# Altium footprint library MEBot.PcbLib: 161 footprints (part 10 of 11)
Each footprint in its own frame and in the unit in brackets; x right, y up, seen from the top. Pads: shape width x height; smd on the part's side, far side on the other; paste and mask are expansions set on the pad; w line width, h text height; cw(c..) or ccw(c..) is an arc to the next point about the centre after c.
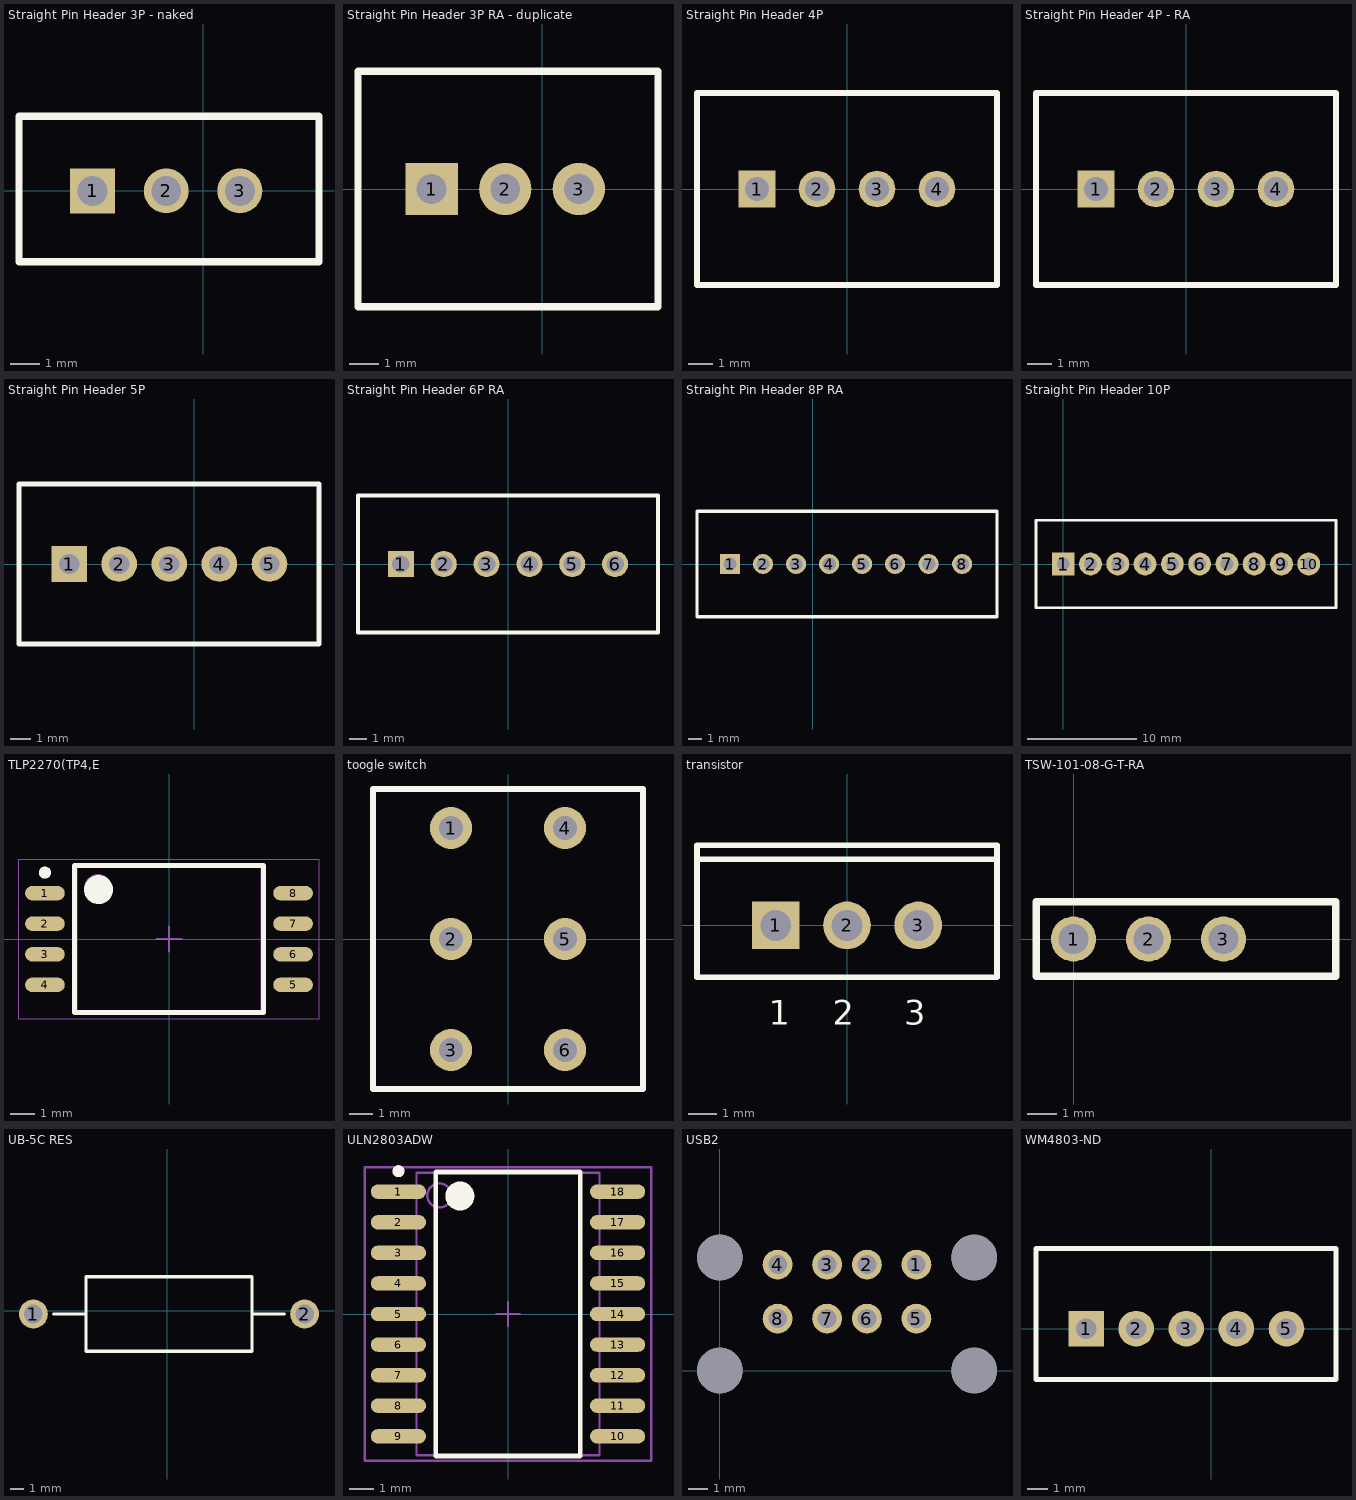
[diagram p9: the footprints below, top view; thin cyan lines are the x and y axes]

## Straight Pin Header 3P - naked [mil] "2.5mm pitch header for full lock & discrete wire connection"
height 433.07
pads (3):
  rect 60x60 hole 40: 1(-147.64,0)
  round 60 hole 40: 2(-49.21,0) 3(49.21,0)
Top Overlay:
  lines w10: -246.06,-95 155,-95 155,100 -246.06,100 -246.06,-95

## Straight Pin Header 3P RA - duplicate [mil] "2.5mm pitch header for full lock & discrete wire connection"
height 433.07
pads (3):
  rect 70x70 hole 40: 1(-147.64,0)
  round 70 hole 40: 2(-49.21,0) 3(49.21,0)
Top Overlay:
  lines w10: -246.06,-157.48 155,-157.48 155,157.48 -246.06,157.48 -246.06,-157.48
3D body "DF1E-3P-2.5DS.stp": height 75.2, standoff -373.62, extent -246,-425.74 147.71,117.57

## Straight Pin Header 4P [mil] "2.5mm pitch header for full lock & discrete wire connection"
height 433.07
pads (4):
  rect 60x60 hole 40: 1(-147.64,0)
  round 60 hole 40: 2(-49.21,0) 3(49.21,0) 4(147.64,0)
Top Overlay:
  lines w10: -246.06,-157.48 246.06,-157.48 246.06,157.48 -246.06,157.48 -246.06,-157.48
3D body "hirose_conn_header4p.stp": height 445.2, standoff -121.73, extent -251.06,-162.48 241.06,172.17

## Straight Pin Header 4P - RA [mil] "2.5mm pitch header for full lock & discrete wire connection"
height 433.07
pads (4):
  rect 60x60 hole 40: 1(-147.64,0)
  round 60 hole 40: 2(-49.21,0) 3(49.21,0) 4(147.64,0)
Top Overlay:
  lines w10: -246.06,-157.48 246.06,-157.48 246.06,157.48 -246.06,157.48 -246.06,-157.48
3D body "DF1E-4P-2.5DS.STEP": height 353.62, standoff -95.2, extent -245,-421.65 247.13,121.65

## Straight Pin Header 5P [mil] "2.5mm pitch header for full lock & discrete wire connection"
height 433.07
pads (5):
  rect 70x70 hole 40: 1(-246.06,0)
  round 70 hole 40: 2(-147.64,0) 3(-49.21,0) 4(49.21,0) 5(147.64,0)
Top Overlay:
  lines w10: -344.49,-157.48 245,-157.48 245,157.48 -344.49,157.48 -344.49,-157.48
3D body "straight 5P header.stp": height 475.2, standoff -91.73, extent -345,-145 245.55,189.65

## Straight Pin Header 6P RA [mil] "2.5mm pitch header for full lock & discrete wire connection"
height 433.07
pads (6):
  rect 60x60 hole 40: 1(-246.06,0)
  round 60 hole 40: 2(-147.64,0) 3(-49.21,0) 4(49.21,0) 5(147.64,0) 6(246.06,0)
Top Overlay:
  lines w10: -344.49,-157.48 -344.49,157.48 344.49,157.48 344.49,-157.48 -344.49,-157.48
3D body "DF1E-6P-2.5DS.stp": height 343.62, standoff -105.2, extent -347.67,-425.19 341.31,118.12

## Straight Pin Header 8P RA [mil] "2.5mm pitch header for full lock & discrete wire connection"
height 433.07
pads (8):
  rect 60x60 hole 40: 1(-246.06,0)
  round 60 hole 40: 2(-147.64,0) 3(-49.21,0) 4(49.21,0) 5(147.64,0) 6(246.06,0) 7(346.06,0) 8(446.06,0)
Top Overlay:
  lines w10: -344.49,-157.48 550,-157.48 550,157.48 -344.49,157.48 -344.49,-157.48
3D body "DF1E-8P-2.5DS.stp": height 343.62, standoff -105.2, extent -342.91,-430 542.91,113.31

## Straight Pin Header 10P [mm] "2.5mm pitch header for full lock & discrete wire connection"
height 11
pads (10):
  rect 2.1x2.1 hole 1.18: 1(0,0)
  round 2.1 hole 1.18: 2(2.5,0) 3(5,0) 4(7.5,0) 5(10,0) 6(12.5,0) 7(15,0) 8(17.5,0) 9(20,0) 10(22.5,0)
Top Overlay:
  lines w0.254: -2.5,-4 -2.5,4 25,4 25,-4 -2.5,-4
3D body: height 10.69, standoff 0, extent -2.627,-4.127 25.127,4.127
3D body: height 3.61, standoff 0, extent 21.893,-0.61 23.092,0.592
3D body: height 3.61, standoff 0, extent 19.403,-0.61 20.603,0.592
3D body: height 3.61, standoff 0, extent 16.914,-0.61 18.113,0.592
3D body: height 3.61, standoff 0, extent 14.4,-0.584 15.599,0.617
3D body: height 3.61, standoff 0, extent 11.92,-0.617 13.12,0.584
3D body: height 3.61, standoff 0, extent 9.396,-0.601 10.595,0.601
3D body: height 3.61, standoff 0, extent 6.907,-0.575 8.106,0.626
3D body: height 3.61, standoff 0, extent 4.392,-0.617 5.591,0.584
3D body: height 3.61, standoff 0, extent 1.928,-0.626 3.127,0.575
3D body: height 3.61, standoff 0, extent -0.612,-0.601 0.587,0.601

## TLP2270(TP4,E [mm] "PHOTOCOUPLER HI-SPEED LOW INPUT"
height 2.1
pads (8):
  oval 1.65x0.6 smd: 1(-5.15,1.905) 2(-5.15,0.635) 3(-5.15,-0.635) 4(-5.15,-1.905) 5(5.15,-1.905) 6(5.15,-0.635) 7(5.15,0.635) 8(5.15,1.905)
Top Overlay:
  circle w0.25: c-5.15,2.755 r0.125
  circle w0.6: c-2.925,2.05 r0.3
  lines w0.2: -3.925,-3.05 -3.925,3.05 3.925,3.05 3.925,-3.05 -3.925,-3.05
Mechanical 13:
  circle w0.1: c-2.95,2.15 r0.5
  lines w0.1: -3.85,-3.05 -3.85,3.05 3.85,3.05 3.85,-3.05 -3.85,-3.05
Mechanical 15:
  lines w0.05: -6.225,-3.3 -6.225,3.3 6.225,3.3 6.225,-3.3 -6.225,-3.3
  lines w0.1: -0.5,0 0.5,0 ; 0,-0.5 0,0.5
3D body: height 2.1, standoff 0.1, extent -3.85,-3.05 3.85,3.05

## toogle switch [mil]
pads (6):
  round 70 hole 40: 1(-95,185) 2(-95,0) 3(-95,-185) 4(95,185) 5(95,0) 6(95,-185)
Top Overlay:
  lines w10: -225,-250 225,-250 225,250 -225,250 -225,-250
3D body "toggle_switch.STEP": height 774.33, standoff -137.09, extent -223.82,-250 225,250

## transistor [mm] "TO, Thru-Hole, Vertical, Heatsink Mounted; 3 In-Line Leads; Pitch 2.54 mm"
height 22.9
pads (3):
  rect 1.7x1.7 hole 1.1: 1(-2.54,0)
  round 1.7 hole 1.1: 2(0,0) 3(2.54,0)
Top Overlay:
  lines w0.2: -5.35,2.35 5.35,2.35 ; -5.35,-1.85 -5.35,2.85 5.35,2.85 5.35,-1.85 -5.35,-1.85
  text "3" at 2.04,-3.825 h1.5
  text "2" at -0.5,-3.825 h1.5
  text "1" at -2.79,-3.825 h1.5
3D body "TO-220.STEP": height 21.71, standoff -7.36, extent -5.18,-1.495 4.98,2.7

## TSW-101-08-G-T-RA [mil] "CONN HEADER R/A 3POS"
pads (3):
  round 60 hole 40: 1(0,0) 2(100,0) 3(200,0)
Top Overlay:
  lines w10: -50,-50 350,-50 350,50 -50,50 -50,-50
3D body "TSW-101-08-G-T-RA.stp": height 327.17, standoff -82.83, extent -12.5,-49.99 590,50.01

## UB-5C RES [mil]
pads (2):
  round 85 hole 55: 1(-395.54,-10.24) 2(404.46,-10.24)
Top Overlay:
  lines w10: -335.54,-10.24 -240.54,-10.24 ; 249.46,-10.24 344.46,-10.24 ; -240.54,-10.24 -240.54,99.76 249.46,99.76 249.46,-120.24 -240.54,-120.24 -240.54,-10.24
3D body "RES 5p.step": height 181.25, standoff 0, extent -266.83,-73.52 263.17,38.98

## ULN2803ADW [mm] "SOIC, 18-Leads, Body 11.8x7.6mm (max), Pitch 1.27mm, IPC Medium Density"
height 2.65
pads (18):
  oval 2.3x0.6 smd: 1(-4.55,5.08) 2(-4.55,3.81) 3(-4.55,2.54) 4(-4.55,1.27) 5(-4.55,0) 6(-4.55,-1.27) 7(-4.55,-2.54) 8(-4.55,-3.81) 9(-4.55,-5.08) 10(4.55,-5.08) 11(4.55,-3.81) 12(4.55,-2.54) 13(4.55,-1.27) 14(4.55,0) 15(4.55,1.27) 16(4.55,2.54) 17(4.55,3.81) 18(4.55,5.08)
Top Overlay:
  circle w0.6: c-2,4.9 r0.3
  circle w0.25: c-4.55,5.93 r0.125
  lines w0.2: -3,-5.9 3,-5.9 3,5.9 -3,5.9 -3,-5.9
Mechanical 13:
  circle w0.1: c-2.85,4.925 r0.5
  lines w0.1: -3.8,-5.875 3.8,-5.875 3.8,5.875 -3.8,5.875 -3.8,-5.875
Mechanical 15:
  lines w0.1: -0.5,0 0.5,0 ; 0,-0.5 0,0.5 ; -5.95,-6.1 5.95,-6.1 5.95,6.1 -5.95,6.1 -5.95,-6.1
3D body: height 2.65, standoff 0.1, extent -3.8,-5.875 3.8,5.875

## USB2 [mil]
height 668
pads (12):
  round 59.06 hole 37: 1(389.5,210) 2(291.5,210) 3(212.5,210) 4(114.5,210) 5(389.5,103) 6(291.5,103) 7(212.5,103) 8(114.5,103)
  round 90.55 hole 90.55: ""(0,0) ""(0,224) ""(504,0) ""(504,224)
3D body "EDAC-690-008-621-013.STEP": height 661.42, standoff -127.81, extent -59.06,-427.56 563.99,259.84

## WM4803-ND [mil] "CONN HEADER VERT 5POS 2.54MM"
height 433.07
pads (5):
  rect 70x70 hole 40: 1(-246.06,0)
  round 70 hole 40: 2(-147.64,0) 3(-49.21,0) 4(49.21,0) 5(147.64,0)
Top Overlay:
  lines w10: -344.49,-100 245,-100 245,157.48 -344.49,157.48 -344.49,-100
3D body "705430004.stp": height 464.96, standoff -130.04, extent -350,-100 250,160